# Altium footprint library Connectors.PcbLib: 408 footprints (part 23 of 26)
Each footprint in its own frame and in the unit in brackets; x right, y up, seen from the top. Pads: shape width x height; smd on the part's side, far side on the other; paste and mask are expansions set on the pad; w line width, h text height; cw(c..) or ccw(c..) is an arc to the next point about the centre after c.
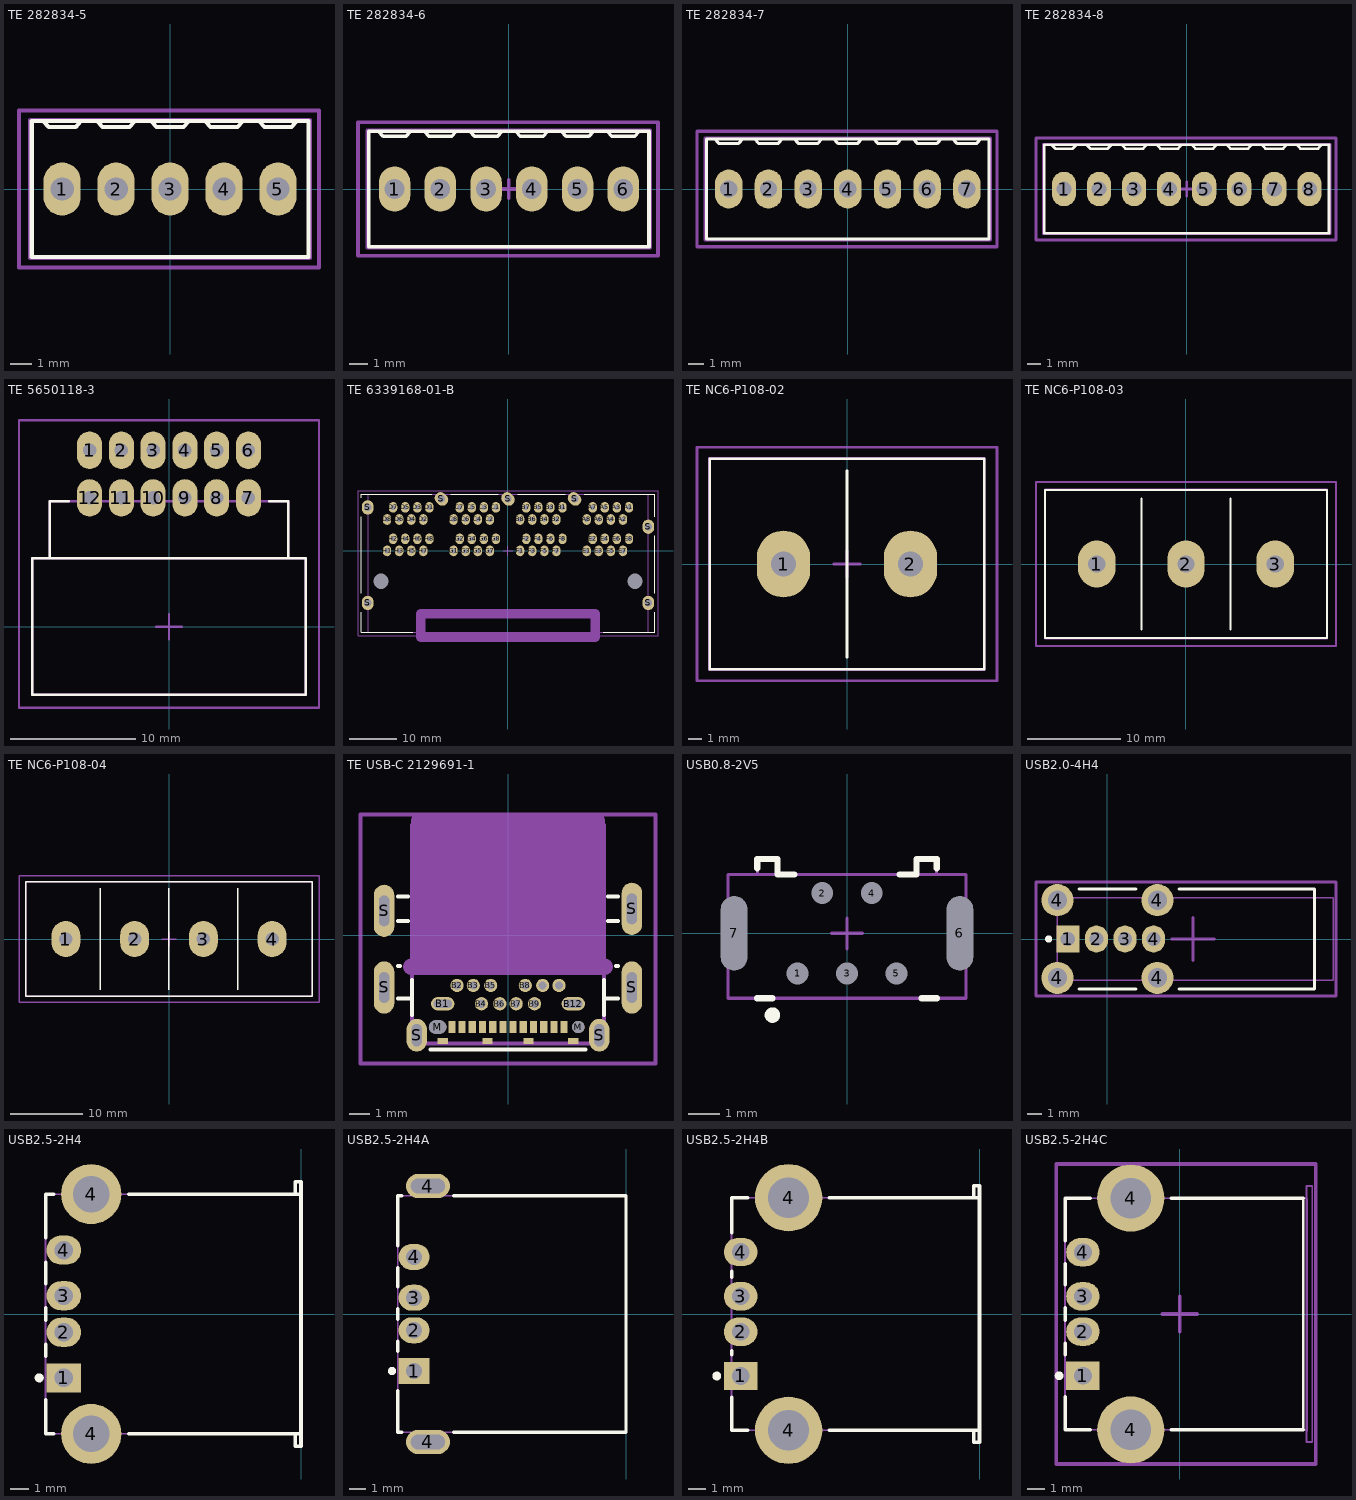
[diagram p22: the footprints below, top view; thin cyan lines are the x and y axes]

## TE 282834-5 [mm]
height 10
pads (5):
  oval 1.75x2.5 hole 1.1: 1(-5.08,0) 2(-2.54,0) 3(0,0) 4(2.54,0) 5(5.08,0)
Top Overlay:
  lines w0.2: -5.969,3.2 -5.715,2.921 -4.445,2.921 -4.191,3.2 ; -3.429,3.2 -3.175,2.921 -1.905,2.921 -1.651,3.2 ; -0.889,3.2 -0.635,2.921 0.635,2.921 0.889,3.2 ; 1.651,3.2 1.905,2.921 3.175,2.921 3.429,3.2 ; 4.191,3.2 4.445,2.921 5.715,2.921 5.969,3.2 ; -6.51,-3.2 -6.51,3.2 6.51,3.2 6.51,-3.2 -6.41,-3.2 -6.51,-3.2
Mechanical 13:
  lines w0.2: -6.58,-3.25 6.58,-3.25 6.58,3.25 -6.58,3.25 -6.58,-3.25
Mechanical 15:
  lines w0.2: -0.5,0 0.5,0 ; 0,-0.5 0,0.5 ; -7.11,-3.7 -7.11,-3.3 -7.11,3.7 7.01,3.7 7.01,-2.9 7.01,-3.7 -7.11,-3.7
3D body "TE Term Block 5port 282834-5-c-3d.STEP": height 10, standoff -3.4, extent -6.58,-3.25 6.58,3.25

## TE 282834-6 [mm]
height 10
pads (6):
  oval 1.75x2.5 hole 1.1: 1(-6.35,0) 2(-3.81,0) 3(-1.27,0) 4(1.27,0) 5(3.81,0) 6(6.35,0)
Top Overlay:
  lines w0.2: -7.239,3.2 -6.985,2.921 -5.715,2.921 -5.461,3.2 ; -4.699,3.2 -4.445,2.921 -3.175,2.921 -2.921,3.2 ; -2.159,3.2 -1.905,2.921 -0.635,2.921 -0.381,3.2 ; 0.381,3.2 0.635,2.921 1.905,2.921 2.159,3.2 ; 2.921,3.2 3.175,2.921 4.445,2.921 4.699,3.2 ; 5.461,3.2 5.715,2.921 6.985,2.921 7.239,3.2 ; -7.78,-3.2 -7.68,-3.2 7.78,-3.2 7.78,3.2 -7.78,3.2 -7.78,-3.2
Mechanical 13:
  lines w0.2: -7.85,-3.25 -7.85,3.25 7.85,3.25 7.85,-3.25 -7.85,-3.25
Mechanical 15:
  lines w0.2: -0.5,0 0.5,0 ; 0,-0.5 0,0.5 ; -8.38,-3.7 8.28,-3.7 8.28,-2.9 8.28,3.7 -8.38,3.7 -8.38,-3.3 -8.38,-3.7
3D body "TE Term Block 6port 282834-6-c-3d.STEP": height 10, standoff -3.4, extent -7.85,-3.25 7.85,3.25

## TE 282834-7 [mm]
height 10
pads (7):
  oval 1.75x2.5 hole 1.1: 1(-7.62,0) 2(-5.08,0) 3(-2.54,0) 4(0,0) 5(2.54,0) 6(5.08,0) 7(7.62,0)
Top Overlay:
  lines w0.2: -8.509,3.2 -8.255,2.921 -6.985,2.921 -6.731,3.2 ; -5.969,3.2 -5.715,2.921 -4.445,2.921 -4.191,3.2 ; -3.429,3.2 -3.175,2.921 -1.905,2.921 -1.651,3.2 ; -0.889,3.2 -0.635,2.921 0.635,2.921 0.889,3.2 ; 1.651,3.2 1.905,2.921 3.175,2.921 3.429,3.2 ; 4.191,3.2 4.445,2.921 5.715,2.921 5.969,3.2 ; 6.731,3.2 6.985,2.921 8.255,2.921 8.509,3.2 ; -9.05,-3.2 -9.05,3.2 9.05,3.2 9.05,-3.2 -8.95,-3.2 -9.05,-3.2
Mechanical 13:
  lines w0.2: -9.12,-3.25 9.12,-3.25 9.12,3.25 -9.12,3.25 -9.12,-3.25
Mechanical 15:
  lines w0.2: -0.5,0 0.5,0 ; 0,-0.5 0,0.5 ; -9.65,-3.7 -9.65,-3.3 -9.65,3.7 9.55,3.7 9.55,-2.9 9.55,-3.7 -9.65,-3.7
3D body "TE Term Block 7port 282834-7-c-3d.STEP": height 10, standoff -3.4, extent -9.12,-3.25 9.12,3.25

## TE 282834-8 [mm]
height 10
pads (8):
  oval 1.75x2.5 hole 1.1: 1(-8.89,0) 2(-6.35,0) 3(-3.81,0) 4(-1.27,0) 5(1.27,0) 6(3.81,0) 7(6.35,0) 8(8.89,0)
Top Overlay:
  lines w0.2: -9.779,3.2 -9.525,2.921 -8.255,2.921 -8.001,3.2 ; -7.239,3.2 -6.985,2.921 -5.715,2.921 -5.461,3.2 ; -4.699,3.2 -4.445,2.921 -3.175,2.921 -2.921,3.2 ; -2.159,3.2 -1.905,2.921 -0.635,2.921 -0.381,3.2 ; 0.381,3.2 0.635,2.921 1.905,2.921 2.159,3.2 ; 2.921,3.2 3.175,2.921 4.445,2.921 4.699,3.2 ; 5.461,3.2 5.715,2.921 6.985,2.921 7.239,3.2 ; 8.001,3.2 8.255,2.921 9.525,2.921 9.779,3.2 ; -10.32,-3.2 -10.22,-3.2 10.32,-3.2 10.32,3.2 -10.32,3.2 -10.32,-3.2
Mechanical 13:
  lines w0.2: -10.39,-3.25 -10.39,3.25 10.39,3.25 10.39,-3.25 -10.39,-3.25
Mechanical 15:
  lines w0.2: -0.5,0 0.5,0 ; 0,-0.5 0,0.5 ; -10.92,-3.7 10.82,-3.7 10.82,-2.9 10.82,3.7 -10.92,3.7 -10.92,-3.3 -10.92,-3.7
3D body "TE Term Block 8port 282834-8-c-3d.STEP": height 10, standoff -3.4, extent -10.39,-3.25 10.39,3.25

## TE 5650118-3 [mm]
height 9.35
pads (12):
  oval 2x3 hole 1.07: 1(-6.35,14.097) 2(-3.81,14.097) 3(-1.27,14.097) 4(1.27,14.097) 5(3.81,14.097) 6(6.35,14.097) 7(6.35,10.287) 8(3.81,10.287) 9(1.27,10.287) 10(-1.27,10.287) 11(-3.81,10.287) 12(-6.35,10.287)
Top Overlay:
  lines w0.2: -9.525,5.459 -9.525,10.027 -8,10.027 ; 8,10.027 9.525,10.027 9.525,5.459 ; -10.922,-5.461 10.922,-5.461 10.922,5.459 -10.922,5.459 -10.922,-5.461
Mechanical 1:
  lines w0.2: -9.525,5.459 -9.525,10.027 9.525,10.027 9.525,5.459 ; -10.922,-5.461 -10.922,5.459 10.922,5.459 10.922,-5.461 -10.922,-5.461
Mechanical 15:
  lines w0.2: -1,0 1,0 ; 0,-1 0,1 ; -12,-6.5 -12,16.5 12,16.5 12,-6.5 -12,-6.5
3D body "TE c-5650118-3-a-3d.STEP": height 9.35, standoff -2.29, extent -10.922,-5.461 10.922,14.465

## TE 6339168-01-B [mm]
height 26.16
pads (73):
  oval 1.75x2.25 hole 1.02: A1(25.4,9.14) A2(24.13,6.6) A3(22.86,9.14) A4(21.59,6.6) A5(20.32,9.14) A6(19.05,6.6) A7(17.78,9.14) A8(16.51,6.6) B1(11.43,9.14) B2(10.16,6.6) B3(8.89,9.14) B4(7.62,6.6) B5(6.35,9.14) B6(5.08,6.6) B7(3.81,9.14) B8(2.54,6.6) C1(-2.54,9.14) C2(-3.81,6.6) C3(-5.08,9.14) C4(-6.35,6.6) C5(-7.62,9.14) C6(-8.89,6.6) C7(-10.16,9.14) C8(-11.43,6.6) D1(-16.51,9.14) D2(-17.78,6.6) D3(-19.05,9.14) D4(-20.32,6.6) D5(-21.59,9.14) D6(-22.86,6.6) D7(-24.13,9.14) D8(-25.4,6.6) E1(16.51,0) E2(17.78,2.54) E3(19.05,0) E4(20.32,2.54) E5(21.59,0) E6(22.86,2.54) E7(24.13,0) E8(25.4,2.54) F1(2.54,0) F2(3.81,2.54) F3(5.08,0) F4(6.35,2.54) F5(7.62,0) F6(8.89,2.54) F7(10.16,0) F8(11.43,2.54) G1(-11.43,0) G2(-10.16,2.54) G3(-8.89,0) G4(-7.62,2.54) G5(-6.35,0) G6(-5.08,2.54) G7(-3.81,0) G8(-2.54,2.54) H1(-25.4,0) H2(-24.13,2.54) H3(-22.86,0) H4(-21.59,2.54) H5(-20.32,0) H6(-19.05,2.54) H7(-17.78,0) H8(-16.51,2.54)
  round 0 hole 3.25 unplated: M(-26.67,-6.35) M(26.67,-6.35)
  oval 2.5x3 hole 1.57: S(-29.46,-10.92) S(-29.46,9.14) S(29.46,-10.92) S(29.46,5.08)
  oval 2.5x3 hole 1.57 rot 45: S(-13.97,10.92) S(0,10.92) S(13.97,10.92)
Top Overlay:
  lines w0.2: -30.8,-12.85 -30.8,-17.05 -20,-17.05 ; -30.8,-8.85 -30.8,7.15 ; -30.8,11.15 -30.8,11.95 -16,11.95 ; -12,11.95 -2,11.95 ; 2,11.95 12,11.95 ; 16,11.95 30.8,11.95 30.8,7.15 ; 20,-17.05 30.8,-17.05 30.8,-12.85 ; 30.8,-8.85 30.8,3.15
Mechanical 1:
  lines w0.2: -29.4,-17.075 29.5,-17.075 29.5,11.915 -29.4,11.915 -29.4,-17.075
Mechanical 15:
  lines w0.2: -1,0 1,0 ; 0,-1 0,1 ; -31.5,-17.85 31.5,-17.85 31.5,12.65 -31.5,12.65 -31.5,-17.85
Milling:
  lines w2: -18.3,-18.15 -18.3,-13.15 0,-13.15 18.3,-13.15 18.3,-18.15 -18.3,-18.15
3D body "TE 6339168-01.STEP": height 26.67, standoff -4.06, extent -30.835,-17.075 30.835,11.915

## TE NC6-P108-02 [mil]
height 650
pads (2):
  oval 157.48x196.85 hole 73: 1(-187.5,0) 2(187.5,0)
Top Overlay:
  lines w7.87: 0,-275.59 0,275.59 ; -405.51,-311.02 -405.51,311.02 405.51,311.02 405.51,-311.02 -405.51,-311.02
Mechanical 1:
  lines w7.87: -405.99,-312.49 -405.99,312.51 405,312.51 405,-312.49 -405.99,-312.49
Mechanical 15:
  lines w7.87: -39.37,0 39.37,0 ; 0,-39.37 0,39.37 ; -442.91,-344.49 -442.91,344.49 442.91,344.49 442.91,-344.49 -442.91,-344.49
3D body "TE NC6-P108-02.STEP": height 645, standoff -180, extent -405.99,-312.49 405,312.51

## TE NC6-P108-03 [mm]
height 16.51
pads (3):
  oval 4x5 hole 1.854: 1(-9.525,0) 2(0,0) 3(9.526,0)
Top Overlay:
  lines w0.2: -4.763,-7 -4.763,7 ; 4.763,-7 4.763,7 ; -15.062,-7.9 15.063,-7.9 15.063,7.9 -15.062,7.9 -15.062,-7.9
Mechanical 1:
  lines w0.2: -15.075,-7.937 15.05,-7.937 15.05,7.938 -15.075,7.938 -15.075,-7.937
Mechanical 15:
  lines w0.2: -1,0 1,0 ; 0,-1 0,1 ; -16.013,-8.75 16.013,-8.75 16.013,8.75 -16.013,8.75 -16.013,-8.75
3D body "TE NC6-P108-03.STEP": height 16.38, standoff -4.57, extent -15.075,-7.937 15.05,7.938

## TE NC6-P108-04 [mm]
height 16.51
pads (4):
  oval 4x5 hole 1.854: 1(-14.289,0) 2(-4.764,0) 3(4.761,0) 4(14.286,0)
Top Overlay:
  lines w0.2: -9.526,-7 -9.526,7 ; -0.001,-7 -0.001,7 ; 9.524,-7 9.524,7 ; -19.826,-7.9 19.826,-7.9 19.826,7.9 -19.826,7.9 -19.826,-7.9
Mechanical 1:
  lines w0.2: -19.838,-7.937 19.813,-7.937 19.813,7.938 -19.838,7.938 -19.838,-7.937
Mechanical 15:
  lines w0.2: -1,0 1,0 ; 0,-1 0,1 ; -20.776,-8.75 20.776,-8.75 20.776,8.75 -20.776,8.75 -20.776,-8.75
3D body "TE NC6-P108-04.STEP": height 16.38, standoff -4.57, extent -19.837,-7.937 19.812,7.938

## TE USB-C 2129691-1 [mm]
height 2.27
pads (36):
  rect 0.35x0.6 smd: A1(2.75,-4.5) A2(2.25,-4.5) A3(1.75,-4.5) A4(1.25,-4.5) A5(0.75,-4.5) A6(0.25,-4.5) A7(-0.25,-4.5) A8(-0.75,-4.5) A9(-1.25,-4.5) A10(-1.75,-4.5) A11(-2.25,-4.5) A12(-2.75,-4.5)
  oval 1.15x0.65 hole 0.4 slot 0.9 at 0 deg: B1(-3.2,-3.36) B12(3.2,-3.36)
  round 0.65 hole 0.4: B2(-2.5,-2.46) B3(-1.7,-2.46) B4(-1.3,-3.36) B5(-0.85,-2.46) B6(-0.4,-3.36) B7(0.4,-3.36) B8(0.85,-2.46) B9(1.3,-3.36) B10(1.7,-2.46) B11(2.5,-2.46)
  oval 0.85x0.65 hole 0.65 slot 0.85 at 0 deg unplated mask+0.102: M(-3.45,-4.5)
  round 0.6 hole 0.6 unplated mask+0.102: M(3.45,-4.5)
  oval 1x2.56 hole 0.5 slot 1.5 at 90 deg: S(-6.075,-2.56) S(-6.075,1.2) S(6.075,-2.56) S(6.075,1.3)
  oval 1x1.6 hole 0.5 slot 1.1 at 90 deg: S(-4.475,-4.9) S(4.475,-4.9)
  rect 0.5x0.3 smd: S(-3.2,-5.19) S(-1,-5.19) S(1,-5.19) S(3.2,-5.19)
Top Overlay:
  lines w0.2: -5.4,-3.1 -4.7,-3.1 ; -5.4,-1.5 -5.3,-1.5 ; -5.4,0.7 -4.9,0.7 ; -5.4,1.9 -4.9,1.9 ; -4.7,-3.9 -4.7,-2.2 ; -3.8,-5.6 0,-5.6 3.8,-5.6 ; 4.7,-3.9 4.7,-2.2 ; 4.7,-3.1 5.4,-3.1 ; 4.9,0.7 5.4,0.7 ; 4.9,1.9 5.4,1.9 ; 5.3,-1.5 5.4,-1.5
Mechanical 1:
  lines w0.2: -4.7,-5.3 0,-5.3 4.7,-5.3 4.7,5.4 0,5.4 -4.7,5.4 -4.7,-5.3
Mechanical 15:
  lines w0.2: -0.635,0 0.635,0 ; 0,-0.635 0,0.635 ; -7.239,-6.278 0,-6.278 7.239,-6.278 7.239,5.914 0,5.914 -7.239,5.914 -7.239,-6.278
Milling:
  region: 4.35,5.61 -4.35,5.61 -4.35,-1.54 4.35,-1.54
  lines w0.8: -4.75,-1.54 4.75,-1.54 ; -4.35,-1.54 -4.35,5.61 0,5.61 4.35,5.61 4.35,-1.54
3D body "TE USB 2129691-1.STEP": height 2.27, standoff -1.07, extent -6.175,-5.3 6.175,5.4

## USB0.8-2V5 [mm] "Connector; USB Mini-B, Type 2, Thru-Hole; 5 Position; Vertical"
height 7.7
pads (7):
  round 0.4 / inner round 0.4 / far side oval 1.1x1.7 hole 0.7: 1(-1.6,-1.3) 2(-0.8,1.3) 3(0,-1.3) 4(0.8,1.3) 5(1.6,-1.3)
  oval 0.55x2.1 / inner oval 0.55x2.1 / far side oval 1.6x3.9 hole 0.85 slot 2.4 at 90 deg: 6(3.65,0) 7(-3.65,0)
Top Overlay:
  circle w0.25: c-2.41,-2.645 r0.125
  lines w0.2: -2.91,-2.1 -2.41,-2.1 ; -2.9,2.1 -2.9,2.4 -2.25,2.4 -2.25,1.9 -1.7,1.9 ; 1.7,1.9 2.25,1.9 2.25,2.4 2.9,2.4 2.9,2.1 ; 2.41,-2.1 2.91,-2.1
Mechanical 13:
  lines w0.1: -2.9,1.9 -2.9,2.4 -2.25,2.4 -2.25,1.9 ; 2.25,1.9 2.25,2.4 2.9,2.4 2.9,1.9 ; -3.85,-2.1 3.85,-2.1 3.85,1.9 -3.85,1.9 -3.85,-2.1
Mechanical 15:
  lines w0.1: -0.5,0 0.5,0 ; 0,-0.5 0,0.5
3D body: height 7.7, standoff 0, extent 2.251,1.901 2.899,2.399
3D body: height 7.7, standoff 0, extent -2.899,1.901 -2.251,2.399
3D body: height 7.7, standoff 0, extent -3.849,-2.099 3.849,1.899

## USB2.0-4H4 [mm] "Connector; USB1.1, Type A, Thru-Hole; 4 Position; Right Angle DESIGNER ABBAS BASEREH"
height 13.83
pads (8):
  rect 1.6x1.9 hole 1: 1(-2.77,0)
  oval 1.6x1.9 hole 1: 2(-0.77,0) 3(1.23,0) 4(3.23,0)
  round 2.25 hole 1.35: 4(-3.5,-2.72) 4(-3.5,2.72) 4(3.5,-2.72) 4(3.5,2.72)
Top Overlay:
  circle w0.25: c-4.12,0 r0.125
  lines w0.2: -1.98,-3.5 2,-3.5 ; -1.98,3.5 2,3.5 ; 5.01,-3.5 14.5,-3.5 14.5,3.5 5.01,3.5
Mechanical 13:
  lines w0.1: -3.5,-2.88 15.79,-2.88 15.79,2.88 -3.5,2.88 -3.5,-2.88
Mechanical 15:
  lines w0.2: 4.5,0 7.5,0 ; 6,-1.5 6,1.5 ; -5,-4 -5,4 16,4 16,-4 -5,-4
3D body "usb_a-usb_a-e.stp": height 14.25, standoff -3.9, extent -3.995,-3.564 15.255,3.556

## USB2.5-2H4 [mm] "Connector; USB1.1, Series A, Reverse Type, Thru-Hole; 4 Position; Right Angle"
height 6.5
pads (6):
  rect 1.9x1.6 hole 1: 1(-13,-3.5)
  oval 1.9x1.6 hole 1: 2(-13,-1) 3(-13,1) 4(-13,3.5)
  round 3.3 hole 2: 4(-11.5,-6.57) 4(-11.5,6.57)
Top Overlay:
  circle w0.25: c-14.35,-3.5 r0.125
  lines w0.2: -14,-4.7 -14,-6.565 -13.55,-6.565 ; -14,-2.3 -14,-1.67 ; -14,-0.33 -14,0.33 ; -14,1.67 -14,2.83 ; -14,4.17 -14,6.565 -13.55,6.565 ; -9.45,-6.565 0,-6.565 ; -9.45,6.565 0,6.565 ; -0.32,-6.565 -0.32,-7.25 0,-7.25 0,7.25 -0.32,7.25 -0.32,6.565
Mechanical 1:
  lines w0.1: 0,-7.25 0,7.25
  text "PCB Edge" at -0.336,-6.303 h0.25
Mechanical 13:
  lines w0.1: -14,-6.565 -0.32,-6.565 -0.32,-7.25 0,-7.25 0,7.25 -0.32,7.25 -0.32,6.565 -14,6.565 -14,-6.565

## USB2.5-2H4A [mm] "Connector; USB1.1, Series A, Reverse Type, Thru-Hole; 4 Position; Right Angle"
height 6.5
pads (6):
  rect 1.9x1.6 hole 1: 1(-13,-3.5)
  oval 1.9x1.6 hole 1: 2(-13,-1) 3(-13,1) 4(-13,3.5)
  oval 2.7x1.5 hole 0.9 slot 2.1 at 0 deg: 4(-12.15,-7.85) 4(-12.15,7.85)
Top Overlay:
  circle w0.25: c-14.35,-3.5 r0.125
  lines w0.2: -14,-4.7 -14,-7.25 -13.74,-7.25 ; -14,-2.3 -14,-1.67 ; -14,-0.33 -14,0.33 ; -14,1.67 -14,2.83 ; -14,4.17 -14,7.25 -13.74,7.25 ; -10.56,-7.25 0,-7.25 0,7.25 -10.56,7.25
Mechanical 1:
  lines w0.1: 0,-7.25 0,7.25
  text "PCB Edge" at -0.324,-6.966 h0.25
Mechanical 13:
  lines w0.1: -14,-7.25 -14,7.25 0,7.25 0,-7.25 -14,-7.25

## USB2.5-2H4B [mm] "Connector; USB1.1, Type A, Thru-Hole; 4 Position; Right Angle"
height 7.01
pads (6):
  rect 1.9x1.6 hole 1: 1(-13.49,-3.5)
  oval 1.9x1.6 hole 1: 2(-13.49,-1) 3(-13.49,1) 4(-13.49,3.5)
  round 3.8 hole 2.3: 4(-10.78,-6.57) 4(-10.78,6.57)
Top Overlay:
  circle w0.25: c-14.84,-3.5 r0.125
  lines w0.2: -14,-4.7 -14,-6.565 -13.08,-6.565 ; -14,-2.3 -14,-2.09 ; -14,2.09 -14,2.41 ; -14,4.59 -14,6.565 -13.08,6.565 ; -8.48,-6.565 0,-6.565 ; -8.48,6.565 0,6.565 ; -0.32,-6.565 -0.32,-7.25 0,-7.25 0,-6.565 ; -0.32,6.565 -0.32,7.25 0,7.25 0,6.565 ; 0,-6.565 0,6.565
Mechanical 13:
  lines w0.1: -14,-6.565 -14,6.565 -0.32,6.565 -0.32,7.25 0,7.25 0,-7.25 -0.32,-7.25 -0.32,-6.565 -14,-6.565

## USB2.5-2H4C [mm] "Connector; USB1.1, Type A, Thru-Hole; 4 Position; Right Angle DESIGNER ABBAS BASEREH"
height 7.01
pads (6):
  rect 1.9x1.6 hole 1: 1(-5.49,-3.5)
  oval 1.9x1.6 hole 1: 2(-5.49,-1) 3(-5.49,1) 4(-5.49,3.5)
  round 3.8 hole 2.3: 4(-2.78,-6.57) 4(-2.78,6.57)
Top Overlay:
  circle w0.25: c-6.84,-3.5 r0.125
  lines w0.15: 7,-6.565 7,6.565
  lines w0.2: -6.5,-4.7 -6.5,-6.565 -5.08,-6.565 ; -6.5,-2.3 -6.5,-1.66 ; -6.5,-0.34 -6.5,0.34 ; -6.5,1.66 -6.5,2.84 ; -6.5,4.16 -6.5,6.565 -5.08,6.565 ; -0.48,-6.565 7,-6.565 ; -0.48,6.565 7,6.565
Mechanical 1:
  lines w0.15: 7.2,-6.6 7.2,6.5
Mechanical 13:
  lines w0.1: -6.5,-6.565 -6.5,6.565 7.18,6.565 7.18,7.25 7.5,7.25 7.5,-7.25 7.18,-7.25 7.18,-6.565 -6.5,-6.565
Mechanical 15:
  lines w0.2: -1,0 1,0 ; 0,-1 0,1 ; -7,-8.5 -7,8.5 7.7,8.5 7.7,-8.5 -7,-8.5
3D body "14388.STEP": height 7.35, standoff -3.5, extent -6.902,-7.9 7.598,7.9